# Altium footprint library TarabusLib_KAP.PcbLib: 504 footprints (part 28 of 32)
Each footprint in its own frame and in the unit in brackets; x right, y up, seen from the top. Pads: shape width x height; smd on the part's side, far side on the other; paste and mask are expansions set on the pad; w line width, h text height; cw(c..) or ccw(c..) is an arc to the next point about the centre after c.
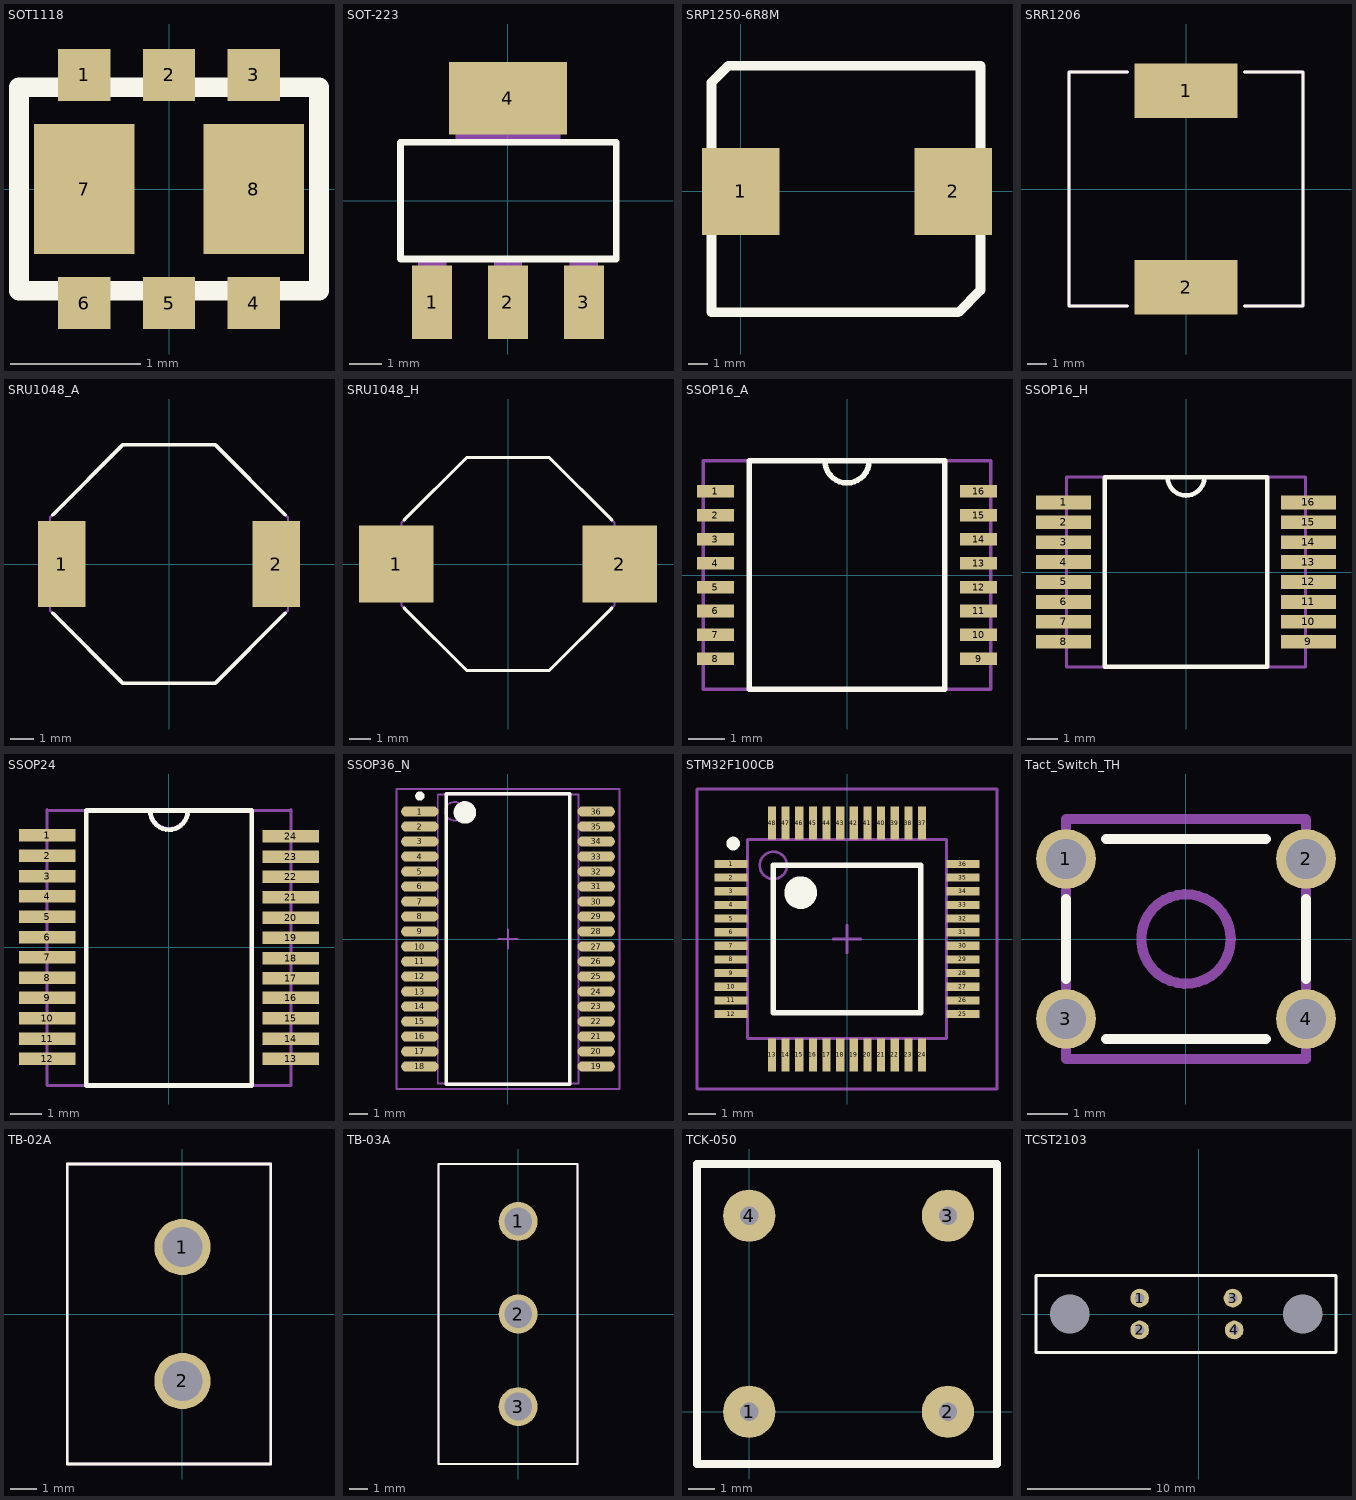
[diagram p27: the footprints below, top view; thin cyan lines are the x and y axes]

## SOT1118 [mm]
pads (8):
  rect 0.4x0.4 smd mask+0: 1(-0.65,0.875) 2(0,0.875) 3(0.65,0.875) 4(0.65,-0.875) 5(0,-0.875) 6(-0.65,-0.875)
  rect 0.77x1 smd mask+0: 7(-0.65,0) 8(0.65,0)
Top Overlay:
  lines w0.15: -1.15,-0.78 -1.15,0.78 1.15,0.78 1.15,-0.78 -1.15,-0.78
3D body: height 0.6, standoff 0, extent -1.15,-0.78 1.13,0.8

## SOT-223 [mil]
pads (4):
  rect 48x88 smd: 1(-90.98,-122.01) 2(0,-122.01) 3(91,-122.01)
  rect 142x87 smd: 4(0,123)
Top Overlay:
  lines w8: -129.02,-70 130,-70 130,70 -129.02,70 -129.02,-70
Mechanical 16:
  rectangle: -63,71 63,144
  rectangle: -17,-144 17,-71
  rectangle: -108,-144 -74,-71
  rectangle: 74,-144 108,-71
  rectangle: -63,71 63,144
  rectangle: -17,-144 17,-71
  rectangle: -108,-144 -74,-71
  rectangle: 74,-144 108,-71

## SRP1250-6R8M [mm] "Bourns Inductor 6.8 uH"
height 6
pads (2):
  rect 4x4.5 smd: 1(0,0) 2(11,0)
Top Overlay:
  lines w0.5: -1.5,-6.25 -1.5,0 -1.5,5.625 -0.625,6.5 12.4,6.5 12.4,-5.1 11.25,-6.25 -1.5,-6.25
3D body: height 6, standoff 0.2, extent -1.5,-6.25 12.375,6.5

## SRR1206 [mm]
pads (2):
  rect 5.3x2.8 smd: 1(0,5.05) 2(0,-5.05)
Top Overlay:
  lines w0.15: -3,-6 -6,-6 -6,6 -3,6 ; 3,-6 6,-6 6,6 3,6
Mechanical 7:
  lines w0.15: -3,-6 -6,-6 -6,6 -3,6 ; 3,-6 6,-6 6,6 3,6
3D body "SRR1206-330YL.STEP": height 6.5, standoff -0.02, extent -6.2,-6.45 6.5,6.45

## SRU1048_A [mm]
height 5.1
pads (2):
  rect 2x3.6 smd: 1(-4.5,0) 2(4.5,0)
Top Overlay:
  lines w0.15: -4.875,-2.075 -1.95,-5 1.95,-5 4.875,-2.075 ; -4.875,2.075 -1.95,5 1.95,5 4.875,2.075
Mechanical 7:
  lines w0.1: -5,-1.95 -5,1.95 -1.95,5 1.95,5 5,1.95 5,-1.95 1.95,-5 -1.95,-5 -5,-1.95
Mechanical 10:
  text ".Comment" at -1.235,5.625 h0.6
  text ".Designator" at -1.235,6.315 h0.8
3D body: height 5.1, standoff 0, extent -5,-5 5,5

## SRU1048_H [mm]
height 5.1
pads (2):
  rect 3.5x3.6 smd: 1(-5.25,0) 2(5.25,0)
Top Overlay:
  lines w0.15: -4.875,-2.075 -1.95,-5 1.95,-5 4.875,-2.075 ; -4.875,2.075 -1.95,5 1.95,5 4.875,2.075
Mechanical 7:
  lines w0.1: -5,-1.95 -1.95,-5 1.95,-5 5,-1.95 5,1.95 1.95,5 -1.95,5 -5,1.95 -5,-1.95
Mechanical 10:
  text ".Designator" at -1.235,6.315 h0.8
  text ".Comment" at -1.235,5.625 h0.6
3D body: height 5.1, standoff 0, extent -5,-5 5,5

## SSOP16_A [mm]
height 1.99
pads (16):
  rect 1x0.34 smd: 1(-3.57,2.275) 2(-3.57,1.625) 3(-3.57,0.975) 4(-3.57,0.325) 5(-3.57,-0.325) 6(-3.57,-0.975) 7(-3.57,-1.625) 8(-3.57,-2.275) 9(3.57,-2.275) 10(3.57,-1.625) 11(3.57,-0.975) 12(3.57,-0.325) 13(3.57,0.325) 14(3.57,0.975) 15(3.57,1.625) 16(3.57,2.275)
Top Overlay:
  lines w0.15: -0.6,3.1 ccw(c0,3.1) 0.6,3.09 ; -2.65,-3.1 2.65,-3.1 2.65,3.1 -2.65,3.1 -2.65,-3.1
Mechanical 7:
  lines w0.1: -2.65,-3.1 -2.65,3.1 ; -0.6,3.1 ccw(c0,3.1) 0.6,3.09 ; 2.65,-3.1 2.65,3.1 ; -3.9,-3.1 -3.9,3.1 3.9,3.1 3.9,-3.1 -3.9,-3.1
Mechanical 10:
  text ".Comment" at -1.02,-3.71 h0.6
  text ".Designator" at -1.23,3.46 h0.8
3D body: height 0.75, standoff 0, extent 2.65,-3.1 3.9,3.1
3D body: height 0.75, standoff 0, extent -3.9,-3.1 -2.65,3.1
3D body: height 1.99, standoff 0, extent -2.65,-3.1 2.65,3.1

## SSOP16_H [mm]
height 1.99
pads (16):
  rect 1.8x0.45 smd: 1(-4,2.275) 2(-4,1.625) 3(-4,0.975) 4(-4,0.325) 5(-4,-0.325) 6(-4,-0.975) 7(-4,-1.625) 8(-4,-2.275) 9(4,-2.275) 10(4,-1.625) 11(4,-0.975) 12(4,-0.325) 13(4,0.325) 14(4,0.975) 15(4,1.625) 16(4,2.275)
Top Overlay:
  lines w0.15: -0.6,3.1 ccw(c0,3.1) 0.6,3.09 ; -2.65,-3.1 -2.65,3.1 2.65,3.1 2.65,-3.1 -2.65,-3.1
Mechanical 7:
  lines w0.1: -2.65,-3.1 -2.65,3.1 ; -0.6,3.1 ccw(c0,3.1) 0.6,3.09 ; 2.65,-3.1 2.65,3.1 ; -3.9,-3.1 -3.9,3.1 3.9,3.1 3.9,-3.1 -3.9,-3.1
Mechanical 10:
  text ".Designator" at -1.23,3.46 h0.8
  text ".Comment" at -0.67,-3.72 h0.6
3D body: height 1.99, standoff 0, extent -2.65,-3.1 2.65,3.1
3D body: height 0.75, standoff 0, extent -3.9,-3.1 -2.65,3.1
3D body: height 0.75, standoff 0, extent 2.65,-3.1 3.9,3.1

## SSOP24 [mm]
height 1.85
pads (24):
  rect 1.8x0.4 smd: 1(-3.9,3.575) 2(-3.9,2.925) 3(-3.9,2.275) 4(-3.9,1.625) 5(-3.9,0.975) 6(-3.9,0.325) 7(-3.9,-0.325) 8(-3.9,-0.975) 9(-3.9,-1.625) 10(-3.9,-2.275) 11(-3.9,-2.925) 12(-3.9,-3.575) 13(3.9,-3.575) 14(3.9,-2.925) 15(3.9,-2.275) 16(3.9,-1.625) 17(3.9,-1) 18(3.9,-0.35) 19(3.9,0.3) 20(3.9,0.95) 21(3.9,1.6) 22(3.9,2.25) 23(3.9,2.9) 24(3.9,3.55)
Top Overlay:
  lines w0.15: -0.6,4.36 ccw(c0,4.36) 0.6,4.35 ; -2.65,-4.425 -2.65,4.375 2.65,4.375 2.65,-4.425 -2.65,-4.425
Mechanical 7:
  lines w0.1: -3.9,4.375 3.9,4.375 ; -3.9,4.4 -3.9,-4.425 3.9,-4.425 3.9,4.4 ; -2.65,-1.8 -2.65,4.35 ; -0.6,4.4 ccw(c0,4.4) 0.6,4.39 ; 2.65,-1.8 2.65,4.4
Mechanical 10:
  text ".Designator" at -1.5,4.725 h0.8
  text ".Comment" at -0.95,-5.05 h0.6
3D body: height 1.99, standoff 0, extent -2.65,-4.425 2.65,4.45
3D body: height 0.75, standoff 0, extent -3.9,-4.425 -2.65,4.4
3D body: height 0.75, standoff 0, extent 2.65,-4.425 3.9,4.4

## SSOP36_N [mm] "36-Pin Small Outline Package 0.8 mm Pitch, IPC Medium Density"
height 2.65
pads (36):
  oval 2x0.55 smd: 1(-4.7,6.8) 2(-4.7,6) 3(-4.7,5.2) 4(-4.7,4.4) 5(-4.7,3.6) 6(-4.7,2.8) 7(-4.7,2) 8(-4.7,1.2) 9(-4.7,0.4) 10(-4.7,-0.4) 11(-4.7,-1.2) 12(-4.7,-2) 13(-4.7,-2.8) 14(-4.7,-3.6) 15(-4.7,-4.4) 16(-4.7,-5.2) 17(-4.7,-6) 18(-4.7,-6.8) 19(4.7,-6.8) 20(4.7,-6) 21(4.7,-5.2) 22(4.7,-4.4) 23(4.7,-3.6) 24(4.7,-2.8) 25(4.7,-2) 26(4.7,-1.2) 27(4.7,-0.4) 28(4.7,0.4) 29(4.7,1.2) 30(4.7,2) 31(4.7,2.8) 32(4.7,3.6) 33(4.7,4.4) 34(4.7,5.2) 35(4.7,6) 36(4.7,6.8)
Top Overlay:
  circle w0.25: c-4.7,7.625 r0.125
  circle w0.6: c-2.3,6.75 r0.3
  lines w0.2: -3.3,-7.75 -3.3,7.75 3.3,7.75 3.3,-7.75 -3.3,-7.75
Mechanical 13:
  circle w0.1: c-2.85,6.81 r0.5
  lines w0.1: -3.75,-7.71 -3.75,7.71 3.75,7.71 3.75,-7.71 -3.75,-7.71
Mechanical 15:
  lines w0.1: -0.5,0 0.5,0 ; 0,-0.5 0,0.5 ; -5.95,-8 -5.95,8 5.95,8 5.95,-8 -5.95,-8
3D body: height 2.65, standoff 0, extent -3.75,-7.71 3.75,7.71

## STM32F100CB [mm] "TSQFP, 48-Leads, Body 9,7x9,7mm (max), Pitch 0,50mm, IPC Medium Density"
height 1.6
pads (48):
  rect 1.2x0.3 smd: 1(-4.25,2.75) 2(-4.25,2.25) 3(-4.25,1.75) 4(-4.25,1.25) 5(-4.25,0.75) 6(-4.25,0.25) 7(-4.25,-0.25) 8(-4.25,-0.75) 9(-4.25,-1.25) 10(-4.25,-1.75) 11(-4.25,-2.25) 12(-4.25,-2.75) 25(4.25,-2.75) 26(4.25,-2.25) 27(4.25,-1.75) 28(4.25,-1.25) 29(4.25,-0.75) 30(4.25,-0.25) 31(4.25,0.25) 32(4.25,0.75) 33(4.25,1.25) 34(4.25,1.75) 35(4.25,2.25) 36(4.25,2.75)
  rect 0.3x1.2 smd: 13(-2.75,-4.25) 14(-2.25,-4.25) 15(-1.75,-4.25) 16(-1.25,-4.25) 17(-0.75,-4.25) 18(-0.25,-4.25) 19(0.25,-4.25) 20(0.75,-4.25) 21(1.25,-4.25) 22(1.75,-4.25) 23(2.25,-4.25) 24(2.75,-4.25) 37(2.75,4.25) 38(2.25,4.25) 39(1.75,4.25) 40(1.25,4.25) 41(0.75,4.25) 42(0.25,4.25) 43(-0.25,4.25) 44(-0.75,4.25) 45(-1.25,4.25) 46(-1.75,4.25) 47(-2.25,4.25) 48(-2.75,4.25)
Top Overlay:
  circle w0.6: c-1.7,1.7 r0.3
  circle w0.25: c-4.175,3.5 r0.125
  lines w0.2: -2.7,-2.7 2.7,-2.7 2.7,2.7 -2.7,2.7 -2.7,-2.7
Mechanical 13:
  circle w0.1: c-2.7,2.7 r0.5
  lines w0.1: -3.65,-3.65 3.65,-3.65 3.65,3.65 -3.65,3.65 -3.65,-3.65
Mechanical 15:
  lines w0.1: -0.5,0 0.5,0 ; 0,-0.5 0,0.5 ; -5.5,-5.5 5.5,-5.5 5.5,5.5 -5.5,5.5 -5.5,-5.5
3D body: height 1.6, standoff 0.05, extent -3.65,-3.65 3.65,3.65

## Tact_Switch_TH [mm]
height 5
pads (4):
  round 1.5 hole 1 mask+0.075: 1(-3,2) 2(3,2) 3(-3,-2) 4(3,-2)
Top Overlay:
  lines w0.254: -3,-1 -3,1 ; -2,-2.5 2,-2.5 ; -2,2.5 2,2.5 ; 3,-1 3,1
Mechanical 9:
  circle w0.254: c0,0 r1.118
  lines w0.254: -3,-3 3,-3 3,3 -3,3 -3,-3
3D body: height 4, standoff 0, extent -1.118,-1.118 1.118,1.118
3D body: height 3.5, standoff 0.05, extent -3,-3 3,3

## TB-02A [mm]
pads (2):
  round 2.1 hole 1.5: 1(0,2.5) 2(0,-2.5)
Top Overlay:
  lines w0.1: -4.3,-5.6 3.3,-5.6 3.3,5.6 -4.3,5.6 -4.3,-5.6
Mechanical 7:
  lines w0.1: -4.3,-5.6 3.3,-5.6 3.3,5.6 -4.3,5.6 -4.3,-5.6
3D body "c-1776244-2-o-3d.stp": height 10, standoff -3.5, extent -4.25,-5.58 3.25,5.58

## TB-03A [mm]
pads (3):
  round 2.1 hole 1.5: 1(0,5) 2(0,0) 3(0,-5)
Top Overlay:
  lines w0.1: -4.3,-8.1 -4.3,8.1 3.2,8.1 3.2,-8.1 -4.3,-8.1
Mechanical 7:
  lines w0.1: -4.3,-8.1 -4.3,8.1 3.2,8.1 3.2,-8.1 -4.3,-8.1
3D body "c-1776244-3-o-3d.stp": height 10, standoff -3.5, extent -4.3,-8.08 3.2,8.08

## TCK-050 [mm]
pads (4):
  round 2 hole 0.7: 1(0,0) 2(7.62,0) 3(7.62,7.52) 4(0,7.52)
Top Overlay:
  lines w0.3: -2,-2 -2,9.5 9.5,9.5 9.5,-2 -2,-2
Mechanical 7:
  lines w0.3: -2,-2 -2,9.5 9.5,9.5 9.5,-2 -2,-2
Mechanical 10:
  text ".Comment" at 6.5,10 h0.6
  text ".Designator" at 6.5,11 h0.8
3D body: height 8.8, standoff 0, extent -2,-2 9.5,9.5

## TCST2103 [mil]
pads (6):
  round 60 hole 30: 1(-188.98,51.18) 2(-188.98,-51.18) 3(110.24,51.18) 4(114.17,-51.18)
  round 60 hole 125.98 unplated: ""(-413.39,0) ""(334.65,0)
Top Overlay:
  lines w10: -521.65,-124.01 -521.65,124.02 440.94,124.02 440.94,-122.05 438.98,-124.01 -521.65,-124.01
3D body: height 437.01, standoff -307.09, extent -521.65,-124.01 442.92,124.02